# Altium footprint library 排针-排母-1.27.PcbLib: 152 footprints (part 8 of 10)
Each footprint in its own frame and in the unit in brackets; x right, y up, seen from the top. Pads: shape width x height; smd on the part's side, far side on the other; paste and mask are expansions set on the pad; w line width, h text height; cw(c..) or ccw(c..) is an arc to the next point about the centre after c.
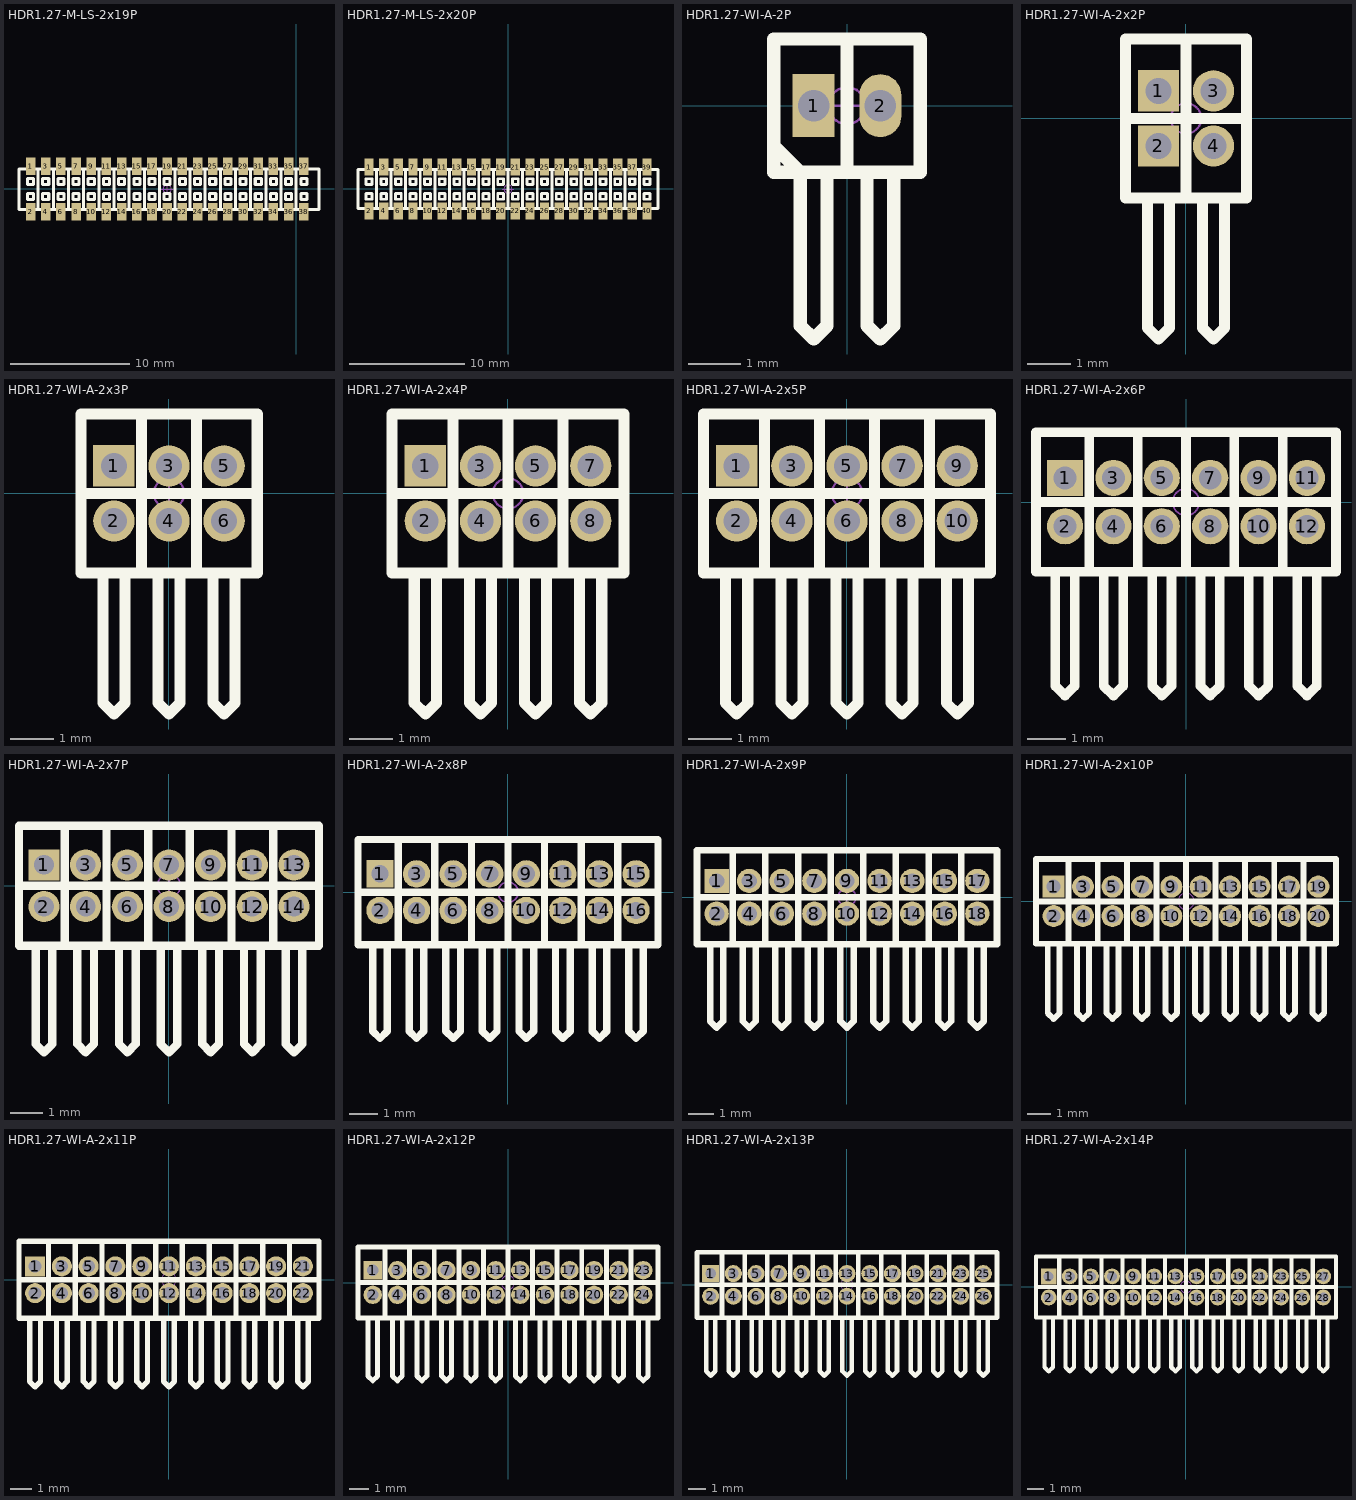
[diagram p7: the footprints below, top view; thin cyan lines are the x and y axes]

## HDR1.27-M-LS-2x19P [mm] "双排贴片排母，脚距：1.27mm"
pads (38):
  rect 0.8x1.5 smd: 1(-22.225,1.905) 2(-22.225,-1.905) 3(-20.955,1.905) 4(-20.955,-1.905) 5(-19.685,1.905) 6(-19.685,-1.905) 7(-18.415,1.905) 8(-18.415,-1.905) 9(-17.145,1.905) 10(-17.145,-1.905) 11(-15.875,1.905) 12(-15.875,-1.905) 13(-14.605,1.905) 14(-14.605,-1.905) 15(-13.335,1.905) 16(-13.335,-1.905) 17(-12.065,1.905) 18(-12.065,-1.905) 19(-10.795,1.905) 20(-10.795,-1.905) 21(-9.525,1.905) 22(-9.525,-1.905) 23(-8.255,1.905) 24(-8.255,-1.905) 25(-6.985,1.905) 26(-6.985,-1.905) 27(-5.715,1.905) 28(-5.715,-1.905) 29(-4.445,1.905) 30(-4.445,-1.905) 31(-3.175,1.905) 32(-3.175,-1.905) 33(-1.905,1.905) 34(-1.905,-1.905) 35(-0.635,1.905) 36(-0.635,-1.905) 37(0.635,1.905) 38(0.635,-1.905)
Top Overlay:
  drawing of 174 lines, arcs and shapes, not listed
Mechanical 15:
  circle w0.05: c-10.795,0 r0.35
  lines w0.05: -11.295,0 -10.295,0 ; -10.795,-0.5 -10.795,0.5
3D body: height 4.67, standoff 0, extent -12.7,-2.4 -11.43,2.4
3D body: height 4.67, standoff 0, extent -13.97,-2.4 -12.7,2.4
3D body: height 4.67, standoff 0, extent -15.24,-2.4 -13.97,2.4
3D body: height 4.67, standoff 0, extent -16.51,-2.4 -15.24,2.4
3D body: height 4.67, standoff 0, extent -17.78,-2.4 -16.51,2.4
3D body: height 4.67, standoff 0, extent -19.05,-2.4 -17.78,2.4
3D body: height 4.67, standoff 0, extent -20.32,-2.4 -19.05,2.4
3D body: height 4.67, standoff 0, extent -21.59,-2.4 -20.32,2.4
3D body: height 4.67, standoff 0, extent -23.06,-2.4 -21.59,2.4
3D body: height 4.67, standoff 0, extent 0,-2.4 1.47,2.4
3D body: height 4.67, standoff 0, extent -11.43,-2.4 -10.16,2.4
3D body: height 4.67, standoff 0, extent -10.16,-2.4 -8.89,2.4
3D body: height 4.67, standoff 0, extent -8.89,-2.4 -7.62,2.4
3D body: height 4.67, standoff 0, extent -7.62,-2.4 -6.35,2.4
3D body: height 4.67, standoff 0, extent -6.35,-2.4 -5.08,2.4
3D body: height 4.67, standoff 0, extent -5.08,-2.4 -3.81,2.4
3D body: height 4.67, standoff 0, extent -3.81,-2.4 -2.54,2.4
3D body: height 4.67, standoff 0, extent -2.54,-2.4 -1.27,2.4
3D body: height 4.67, standoff 0, extent -1.27,-2.4 0,2.4

## HDR1.27-M-LS-2x20P [mm] "双排贴片排母，脚距：1.27mm"
pads (40):
  rect 0.8x1.5 smd: 1(-12.065,1.905) 2(-12.065,-1.905) 3(-10.795,1.905) 4(-10.795,-1.905) 5(-9.525,1.905) 6(-9.525,-1.905) 7(-8.255,1.905) 8(-8.255,-1.905) 9(-6.985,1.905) 10(-6.985,-1.905) 11(-5.715,1.905) 12(-5.715,-1.905) 13(-4.445,1.905) 14(-4.445,-1.905) 15(-3.175,1.905) 16(-3.175,-1.905) 17(-1.905,1.905) 18(-1.905,-1.905) 19(-0.635,1.905) 20(-0.635,-1.905) 21(0.635,1.905) 22(0.635,-1.905) 23(1.905,1.905) 24(1.905,-1.905) 25(3.175,1.905) 26(3.175,-1.905) 27(4.445,1.905) 28(4.445,-1.905) 29(5.715,1.905) 30(5.715,-1.905) 31(6.985,1.905) 32(6.985,-1.905) 33(8.255,1.905) 34(8.255,-1.905) 35(9.525,1.905) 36(9.525,-1.905) 37(10.795,1.905) 38(10.795,-1.905) 39(12.065,1.905) 40(12.065,-1.905)
Top Overlay:
  drawing of 183 lines, arcs and shapes, not listed
Mechanical 15:
  circle w0.05: c0,0 r0.35
  lines w0.05: -0.5,0 0.5,0 ; 0,-0.5 0,0.5
3D body: height 4.67, standoff 0, extent 10.16,-2.4 11.43,2.4
3D body: height 4.67, standoff 0, extent 8.89,-2.4 10.16,2.4
3D body: height 4.67, standoff 0, extent 7.62,-2.4 8.89,2.4
3D body: height 4.67, standoff 0, extent 6.35,-2.4 7.62,2.4
3D body: height 4.67, standoff 0, extent 5.08,-2.4 6.35,2.4
3D body: height 4.67, standoff 0, extent 3.81,-2.4 5.08,2.4
3D body: height 4.67, standoff 0, extent 2.54,-2.4 3.81,2.4
3D body: height 4.67, standoff 0, extent 1.27,-2.4 2.54,2.4
3D body: height 4.67, standoff 0, extent 0,-2.4 1.27,2.4
3D body: height 4.67, standoff 0, extent -1.27,-2.4 0,2.4
3D body: height 4.67, standoff 0, extent 11.43,-2.4 12.9,2.4
3D body: height 4.67, standoff 0, extent -12.9,-2.4 -11.43,2.4
3D body: height 4.67, standoff 0, extent -11.43,-2.4 -10.16,2.4
3D body: height 4.67, standoff 0, extent -10.16,-2.4 -8.89,2.4
3D body: height 4.67, standoff 0, extent -8.89,-2.4 -7.62,2.4
3D body: height 4.67, standoff 0, extent -7.62,-2.4 -6.35,2.4
3D body: height 4.67, standoff 0, extent -6.35,-2.4 -5.08,2.4
3D body: height 4.67, standoff 0, extent -5.08,-2.4 -3.81,2.4
3D body: height 4.67, standoff 0, extent -3.81,-2.4 -2.54,2.4
3D body: height 4.67, standoff 0, extent -2.54,-2.4 -1.27,2.4

## HDR1.27-WI-A-2P [mm] "直插，脚距：1.27mm"
pads (2):
  rect 0.8x1.2 hole 0.6: 1(-0.635,0)
  oval 0.8x1.2 hole 0.6: 2(0.635,0)
Top Overlay:
  lines w0.254: -1.397,-0.762 -0.889,-1.27 ; -0.889,-1.397 -0.889,-4.191 -0.635,-4.445 -0.381,-4.191 -0.381,-1.27 ; 0,-1.27 0,1.27 ; 0.381,-1.397 0.381,-4.191 0.635,-4.445 0.889,-4.191 0.889,-1.27 ; -1.397,-1.27 -1.397,1.27 1.397,1.27 1.397,-1.27 -1.397,-1.27
Mechanical 15:
  circle w0.05: c0,0 r0.35
  lines w0.05: -0.5,0 0.5,0 ; 0,-0.5 0,0.5
3D body: height 3.96, standoff -2.72, extent -1.27,-4.7 1.27,1.2

## HDR1.27-WI-A-2x2P [mm] "双排直插，脚距：1.27mm"
pads (4):
  rect 0.95x0.95 hole 0.6: 1(-0.635,0.635) 2(-0.635,-0.635)
  round 0.95 hole 0.6: 3(0.635,0.635) 4(0.635,-0.635)
Top Overlay:
  lines w0.254: -1.397,0 1.397,0 ; -0.889,-1.905 -0.889,-4.826 -0.635,-5.08 -0.381,-4.826 -0.381,-1.905 ; 0,-1.829 0,1.829 ; 0.381,-1.905 0.381,-4.826 0.635,-5.08 0.889,-4.826 0.889,-1.905 ; -1.397,-1.829 1.397,-1.829 1.397,1.829 -1.397,1.829 -1.397,-1.829
Mechanical 15:
  circle w0.05: c0,0 r0.35
  lines w0.05: -0.5,0 0.5,0 ; 0,-0.5 0,0.5
3D body: height 5.14, standoff -2.65, extent -1.27,-4.7 0,1.7
3D body: height 5.14, standoff -2.65, extent 0,-4.7 1.27,1.7

## HDR1.27-WI-A-2x3P [mm] "双排直插，脚距：1.27mm"
pads (6):
  rect 0.95x0.95 hole 0.6: 1(-1.27,0.635)
  round 0.95 hole 0.6: 2(-1.27,-0.635) 3(0,0.635) 4(0,-0.635) 5(1.27,0.635) 6(1.27,-0.635)
Top Overlay:
  lines w0.254: -2.032,0 2.032,0 ; -1.524,-1.905 -1.524,-4.826 -1.27,-5.08 -1.016,-4.826 -1.016,-1.905 ; -0.635,-1.829 -0.635,1.829 ; -0.254,-1.905 -0.254,-4.826 0,-5.08 0.254,-4.826 0.254,-1.905 ; 0.635,-1.829 0.635,1.829 ; 1.016,-1.905 1.016,-4.826 1.27,-5.08 1.524,-4.826 1.524,-1.905 ; -2.032,-1.829 2.032,-1.829 2.032,1.829 -2.032,1.829 -2.032,-1.829
Mechanical 15:
  circle w0.05: c0,0 r0.35
  lines w0.05: -0.5,0 0.5,0 ; 0,-0.5 0,0.5
3D body: height 5.14, standoff -2.65, extent -1.905,-4.7 -0.635,1.7
3D body: height 5.14, standoff -2.65, extent -0.635,-4.7 0.635,1.7
3D body: height 5.14, standoff -2.65, extent 0.635,-4.7 1.905,1.7

## HDR1.27-WI-A-2x4P [mm] "双排直插，脚距：1.27mm"
pads (8):
  rect 0.95x0.95 hole 0.6: 1(-1.905,0.635)
  round 0.95 hole 0.6: 2(-1.905,-0.635) 3(-0.635,0.635) 4(-0.635,-0.635) 5(0.635,0.635) 6(0.635,-0.635) 7(1.905,0.635) 8(1.905,-0.635)
Top Overlay:
  lines w0.254: -2.667,0 2.667,0 ; -2.159,-1.905 -2.159,-4.826 -1.905,-5.08 -1.651,-4.826 -1.651,-1.905 ; -1.27,-1.829 -1.27,1.829 ; -0.889,-1.905 -0.889,-4.826 -0.635,-5.08 -0.381,-4.826 -0.381,-1.905 ; 0,-1.829 0,1.829 ; 0.381,-1.905 0.381,-4.826 0.635,-5.08 0.889,-4.826 0.889,-1.905 ; 1.27,-1.829 1.27,1.829 ; 1.651,-1.905 1.651,-4.826 1.905,-5.08 2.159,-4.826 2.159,-1.905 ; -2.667,-1.829 2.667,-1.829 2.667,1.829 -2.667,1.829 -2.667,-1.829
Mechanical 15:
  circle w0.05: c0,0 r0.35
  lines w0.05: -0.5,0 0.5,0 ; 0,-0.5 0,0.5
3D body: height 5.14, standoff -2.65, extent -2.54,-4.7 -1.27,1.7
3D body: height 5.14, standoff -2.65, extent -1.27,-4.7 0,1.7
3D body: height 5.14, standoff -2.65, extent 0,-4.7 1.27,1.7
3D body: height 5.14, standoff -2.65, extent 1.27,-4.7 2.54,1.7

## HDR1.27-WI-A-2x5P [mm] "双排直插，脚距：1.27mm"
pads (10):
  rect 0.95x0.95 hole 0.6: 1(-2.54,0.635)
  round 0.95 hole 0.6: 2(-2.54,-0.635) 3(-1.27,0.635) 4(-1.27,-0.635) 5(0,0.635) 6(0,-0.635) 7(1.27,0.635) 8(1.27,-0.635) 9(2.54,0.635) 10(2.54,-0.635)
Top Overlay:
  lines w0.254: -3.302,0 3.302,0 ; -2.794,-1.905 -2.794,-4.826 -2.54,-5.08 -2.286,-4.826 -2.286,-1.905 ; -1.905,-1.829 -1.905,1.829 ; -1.524,-1.905 -1.524,-4.826 -1.27,-5.08 -1.016,-4.826 -1.016,-1.905 ; -0.635,-1.829 -0.635,1.829 ; -0.254,-1.905 -0.254,-4.826 0,-5.08 0.254,-4.826 0.254,-1.905 ; 0.635,-1.829 0.635,1.829 ; 1.016,-1.905 1.016,-4.826 1.27,-5.08 1.524,-4.826 1.524,-1.905 ; 1.905,-1.829 1.905,1.829 ; 2.286,-1.905 2.286,-4.826 2.54,-5.08 2.794,-4.826 2.794,-1.905 ; -3.302,-1.829 3.302,-1.829 3.302,1.829 -3.302,1.829 -3.302,-1.829
Mechanical 15:
  circle w0.05: c0,0 r0.35
  lines w0.05: -0.5,0 0.5,0 ; 0,-0.5 0,0.5
3D body: height 5.14, standoff -2.65, extent -3.175,-4.7 -1.905,1.7
3D body: height 5.14, standoff -2.65, extent -1.905,-4.7 -0.635,1.7
3D body: height 5.14, standoff -2.65, extent -0.635,-4.7 0.635,1.7
3D body: height 5.14, standoff -2.65, extent 0.635,-4.7 1.905,1.7
3D body: height 5.14, standoff -2.65, extent 1.905,-4.7 3.175,1.7

## HDR1.27-WI-A-2x6P [mm] "双排直插，脚距：1.27mm"
pads (12):
  rect 0.95x0.95 hole 0.6: 1(-3.175,0.635)
  round 0.95 hole 0.6: 2(-3.175,-0.635) 3(-1.905,0.635) 4(-1.905,-0.635) 5(-0.635,0.635) 6(-0.635,-0.635) 7(0.635,0.635) 8(0.635,-0.635) 9(1.905,0.635) 10(1.905,-0.635) 11(3.175,0.635) 12(3.175,-0.635)
Top Overlay:
  lines w0.254: -3.937,0 3.937,0 ; -3.429,-1.905 -3.429,-4.826 -3.175,-5.08 -2.921,-4.826 -2.921,-1.905 ; -2.54,-1.829 -2.54,1.829 ; -2.159,-1.905 -2.159,-4.826 -1.905,-5.08 -1.651,-4.826 -1.651,-1.905 ; -1.27,-1.829 -1.27,1.829 ; -0.889,-1.905 -0.889,-4.826 -0.635,-5.08 -0.381,-4.826 -0.381,-1.905 ; 0,-1.829 0,1.829 ; 0.381,-1.905 0.381,-4.826 0.635,-5.08 0.889,-4.826 0.889,-1.905 ; 1.27,-1.829 1.27,1.829 ; 1.651,-1.905 1.651,-4.826 1.905,-5.08 2.159,-4.826 2.159,-1.905 ; 2.54,-1.829 2.54,1.829 ; 2.921,-1.905 2.921,-4.826 3.175,-5.08 3.429,-4.826 3.429,-1.905 ; -3.937,-1.829 -3.937,1.829 3.937,1.829 3.937,-1.829 -3.937,-1.829
Mechanical 15:
  circle w0.05: c0,0 r0.35
  lines w0.05: -0.5,0 0.5,0 ; 0,-0.5 0,0.5
3D body: height 5.14, standoff -2.65, extent 2.54,-4.7 3.81,1.7
3D body: height 5.14, standoff -2.65, extent 1.27,-4.7 2.54,1.7
3D body: height 5.14, standoff -2.65, extent 0,-4.7 1.27,1.7
3D body: height 5.14, standoff -2.65, extent -1.27,-4.7 0,1.7
3D body: height 5.14, standoff -2.65, extent -2.54,-4.7 -1.27,1.7
3D body: height 5.14, standoff -2.65, extent -3.81,-4.7 -2.54,1.7

## HDR1.27-WI-A-2x7P [mm] "双排直插，脚距：1.27mm"
pads (14):
  rect 0.95x0.95 hole 0.6: 1(-3.81,0.635)
  round 0.95 hole 0.6: 2(-3.81,-0.635) 3(-2.54,0.635) 4(-2.54,-0.635) 5(-1.27,0.635) 6(-1.27,-0.635) 7(0,0.635) 8(0,-0.635) 9(1.27,0.635) 10(1.27,-0.635) 11(2.54,0.635) 12(2.54,-0.635) 13(3.81,0.635) 14(3.81,-0.635)
Top Overlay:
  lines w0.254: -4.572,0 4.572,0 ; -4.064,-1.905 -4.064,-4.826 -3.81,-5.08 -3.556,-4.826 -3.556,-1.905 ; -3.175,-1.829 -3.175,1.829 ; -2.794,-1.905 -2.794,-4.826 -2.54,-5.08 -2.286,-4.826 -2.286,-1.905 ; -1.905,-1.829 -1.905,1.829 ; -1.524,-1.905 -1.524,-4.826 -1.27,-5.08 -1.016,-4.826 -1.016,-1.905 ; -0.635,-1.829 -0.635,1.829 ; -0.254,-1.905 -0.254,-4.826 0,-5.08 0.254,-4.826 0.254,-1.905 ; 0.635,-1.829 0.635,1.829 ; 1.016,-1.905 1.016,-4.826 1.27,-5.08 1.524,-4.826 1.524,-1.905 ; 1.905,-1.829 1.905,1.829 ; 2.286,-1.905 2.286,-4.826 2.54,-5.08 2.794,-4.826 2.794,-1.905 ; 3.175,-1.829 3.175,1.829 ; 3.556,-1.905 3.556,-4.826 3.81,-5.08 4.064,-4.826 4.064,-1.905 ; -4.572,-1.829 -4.572,1.829 4.572,1.829 4.572,-1.829 -4.572,-1.829
Mechanical 15:
  circle w0.05: c0,0 r0.35
  lines w0.05: -0.5,0 0.5,0 ; 0,-0.5 0,0.5
3D body: height 5.14, standoff -2.65, extent 3.175,-4.7 4.445,1.7
3D body: height 5.14, standoff -2.65, extent 1.905,-4.7 3.175,1.7
3D body: height 5.14, standoff -2.65, extent 0.635,-4.7 1.905,1.7
3D body: height 5.14, standoff -2.65, extent -0.635,-4.7 0.635,1.7
3D body: height 5.14, standoff -2.65, extent -1.905,-4.7 -0.635,1.7
3D body: height 5.14, standoff -2.65, extent -3.175,-4.7 -1.905,1.7
3D body: height 5.14, standoff -2.65, extent -4.445,-4.7 -3.175,1.7

## HDR1.27-WI-A-2x8P [mm] "双排直插，脚距：1.27mm"
pads (16):
  rect 0.95x0.95 hole 0.6: 1(-4.445,0.635)
  round 0.95 hole 0.6: 2(-4.445,-0.635) 3(-3.175,0.635) 4(-3.175,-0.635) 5(-1.905,0.635) 6(-1.905,-0.635) 7(-0.635,0.635) 8(-0.635,-0.635) 9(0.635,0.635) 10(0.635,-0.635) 11(1.905,0.635) 12(1.905,-0.635) 13(3.175,0.635) 14(3.175,-0.635) 15(4.445,0.635) 16(4.445,-0.635)
Top Overlay:
  lines w0.254: -5.207,0 5.207,0 ; -4.699,-1.905 -4.699,-4.826 -4.445,-5.08 -4.191,-4.826 -4.191,-1.905 ; -3.81,-1.829 -3.81,1.829 ; -3.429,-1.905 -3.429,-4.826 -3.175,-5.08 -2.921,-4.826 -2.921,-1.905 ; -2.54,-1.829 -2.54,1.829 ; -2.159,-1.905 -2.159,-4.826 -1.905,-5.08 -1.651,-4.826 -1.651,-1.905 ; -1.27,-1.829 -1.27,1.829 ; -0.889,-1.905 -0.889,-4.826 -0.635,-5.08 -0.381,-4.826 -0.381,-1.905 ; 0,-1.829 0,1.829 ; 0.381,-1.905 0.381,-4.826 0.635,-5.08 0.889,-4.826 0.889,-1.905 ; 1.27,-1.829 1.27,1.829 ; 1.651,-1.905 1.651,-4.826 1.905,-5.08 2.159,-4.826 2.159,-1.905 ; 2.54,-1.829 2.54,1.829 ; 2.921,-1.905 2.921,-4.826 3.175,-5.08 3.429,-4.826 3.429,-1.905 ; 3.81,-1.829 3.81,1.829 ; 4.191,-1.905 4.191,-4.826 4.445,-5.08 4.699,-4.826 4.699,-1.905 ; -5.207,-1.829 5.207,-1.829 5.207,1.829 -5.207,1.829 -5.207,-1.829
Mechanical 15:
  circle w0.05: c0,0 r0.35
  lines w0.05: -0.5,0 0.5,0 ; 0,-0.5 0,0.5
3D body: height 5.14, standoff -2.65, extent -5.08,-4.7 -3.81,1.7
3D body: height 5.14, standoff -2.65, extent -3.81,-4.7 -2.54,1.7
3D body: height 5.14, standoff -2.65, extent -2.54,-4.7 -1.27,1.7
3D body: height 5.14, standoff -2.65, extent -1.27,-4.7 0,1.7
3D body: height 5.14, standoff -2.65, extent 0,-4.7 1.27,1.7
3D body: height 5.14, standoff -2.65, extent 1.27,-4.7 2.54,1.7
3D body: height 5.14, standoff -2.65, extent 2.54,-4.7 3.81,1.7
3D body: height 5.14, standoff -2.65, extent 3.81,-4.7 5.08,1.7

## HDR1.27-WI-A-2x9P [mm] "双排直插，脚距：1.27mm"
pads (18):
  rect 0.95x0.95 hole 0.6: 1(-5.08,0.635)
  round 0.95 hole 0.6: 2(-5.08,-0.635) 3(-3.81,0.635) 4(-3.81,-0.635) 5(-2.54,0.635) 6(-2.54,-0.635) 7(-1.27,0.635) 8(-1.27,-0.635) 9(0,0.635) 10(0,-0.635) 11(1.27,0.635) 12(1.27,-0.635) 13(2.54,0.635) 14(2.54,-0.635) 15(3.81,0.635) 16(3.81,-0.635) 17(5.08,0.635) 18(5.08,-0.635)
Top Overlay:
  lines w0.254: -5.842,0 5.842,0 ; -5.334,-1.905 -5.334,-4.826 -5.08,-5.08 -4.826,-4.826 -4.826,-1.905 ; -4.445,-1.829 -4.445,1.829 ; -4.064,-1.905 -4.064,-4.826 -3.81,-5.08 -3.556,-4.826 -3.556,-1.905 ; -3.175,-1.829 -3.175,1.829 ; -2.794,-1.905 -2.794,-4.826 -2.54,-5.08 -2.286,-4.826 -2.286,-1.905 ; -1.905,-1.829 -1.905,1.829 ; -1.524,-1.905 -1.524,-4.826 -1.27,-5.08 -1.016,-4.826 -1.016,-1.905 ; -0.635,-1.829 -0.635,1.829 ; -0.254,-1.905 -0.254,-4.826 0,-5.08 0.254,-4.826 0.254,-1.905 ; 0.635,-1.829 0.635,1.829 ; 1.016,-1.905 1.016,-4.826 1.27,-5.08 1.524,-4.826 1.524,-1.905 ; 1.905,-1.829 1.905,1.829 ; 2.286,-1.905 2.286,-4.826 2.54,-5.08 2.794,-4.826 2.794,-1.905 ; 3.175,-1.829 3.175,1.829 ; 3.556,-1.905 3.556,-4.826 3.81,-5.08 4.064,-4.826 4.064,-1.905 ; 4.445,-1.829 4.445,1.829 ; 4.826,-1.905 4.826,-4.826 5.08,-5.08 5.334,-4.826 5.334,-1.905 ; -5.842,-1.829 5.842,-1.829 5.842,1.829 -5.842,1.829 -5.842,-1.829
Mechanical 15:
  circle w0.05: c0,0 r0.35
  lines w0.05: -0.5,0 0.5,0 ; 0,-0.5 0,0.5
3D body: height 5.14, standoff -2.65, extent -5.715,-4.7 -4.445,1.7
3D body: height 5.14, standoff -2.65, extent -4.445,-4.7 -3.175,1.7
3D body: height 5.14, standoff -2.65, extent -3.175,-4.7 -1.905,1.7
3D body: height 5.14, standoff -2.65, extent -1.905,-4.7 -0.635,1.7
3D body: height 5.14, standoff -2.65, extent -0.635,-4.7 0.635,1.7
3D body: height 5.14, standoff -2.65, extent 0.635,-4.7 1.905,1.7
3D body: height 5.14, standoff -2.65, extent 1.905,-4.7 3.175,1.7
3D body: height 5.14, standoff -2.65, extent 3.175,-4.7 4.445,1.7
3D body: height 5.14, standoff -2.65, extent 4.445,-4.7 5.715,1.7

## HDR1.27-WI-A-2x10P [mm] "双排直插，脚距：1.27mm"
pads (20):
  rect 0.95x0.95 hole 0.6: 1(-5.715,0.635)
  round 0.95 hole 0.6: 2(-5.715,-0.635) 3(-4.445,0.635) 4(-4.445,-0.635) 5(-3.175,0.635) 6(-3.175,-0.635) 7(-1.905,0.635) 8(-1.905,-0.635) 9(-0.635,0.635) 10(-0.635,-0.635) 11(0.635,0.635) 12(0.635,-0.635) 13(1.905,0.635) 14(1.905,-0.635) 15(3.175,0.635) 16(3.175,-0.635) 17(4.445,0.635) 18(4.445,-0.635) 19(5.715,0.635) 20(5.715,-0.635)
Top Overlay:
  lines w0.254: -6.477,0 6.477,0 ; -5.969,-1.905 -5.969,-4.826 -5.715,-5.08 -5.461,-4.826 -5.461,-1.905 ; -5.08,-1.829 -5.08,1.829 ; -4.699,-1.905 -4.699,-4.826 -4.445,-5.08 -4.191,-4.826 -4.191,-1.905 ; -3.81,-1.829 -3.81,1.829 ; -3.429,-1.905 -3.429,-4.826 -3.175,-5.08 -2.921,-4.826 -2.921,-1.905 ; -2.54,-1.829 -2.54,1.829 ; -2.159,-1.905 -2.159,-4.826 -1.905,-5.08 -1.651,-4.826 -1.651,-1.905 ; -1.27,-1.829 -1.27,1.829 ; -0.889,-1.905 -0.889,-4.826 -0.635,-5.08 -0.381,-4.826 -0.381,-1.905 ; 0,-1.829 0,1.829 ; 0.381,-1.905 0.381,-4.826 0.635,-5.08 0.889,-4.826 0.889,-1.905 ; 1.27,-1.829 1.27,1.829 ; 1.651,-1.905 1.651,-4.826 1.905,-5.08 2.159,-4.826 2.159,-1.905 ; 2.54,-1.829 2.54,1.829 ; 2.921,-1.905 2.921,-4.826 3.175,-5.08 3.429,-4.826 3.429,-1.905 ; 3.81,-1.829 3.81,1.829 ; 4.191,-1.905 4.191,-4.826 4.445,-5.08 4.699,-4.826 4.699,-1.905 ; 5.08,-1.829 5.08,1.829 ; 5.461,-1.905 5.461,-4.826 5.715,-5.08 5.969,-4.826 5.969,-1.905 ; -6.477,-1.829 6.477,-1.829 6.477,1.829 -6.477,1.829 -6.477,-1.829
Mechanical 15:
  circle w0.05: c0,0 r0.35
  lines w0.05: -0.5,0 0.5,0 ; 0,-0.5 0,0.5
3D body: height 5.14, standoff -2.65, extent -6.35,-4.7 -5.08,1.7
3D body: height 5.14, standoff -2.65, extent -5.08,-4.7 -3.81,1.7
3D body: height 5.14, standoff -2.65, extent -3.81,-4.7 -2.54,1.7
3D body: height 5.14, standoff -2.65, extent -2.54,-4.7 -1.27,1.7
3D body: height 5.14, standoff -2.65, extent -1.27,-4.7 0,1.7
3D body: height 5.14, standoff -2.65, extent 0,-4.7 1.27,1.7
3D body: height 5.14, standoff -2.65, extent 1.27,-4.7 2.54,1.7
3D body: height 5.14, standoff -2.65, extent 2.54,-4.7 3.81,1.7
3D body: height 5.14, standoff -2.65, extent 3.81,-4.7 5.08,1.7
3D body: height 5.14, standoff -2.65, extent 5.08,-4.7 6.35,1.7

## HDR1.27-WI-A-2x11P [mm] "双排直插，脚距：1.27mm"
pads (22):
  rect 0.95x0.95 hole 0.6: 1(-6.35,0.635)
  round 0.95 hole 0.6: 2(-6.35,-0.635) 3(-5.08,0.635) 4(-5.08,-0.635) 5(-3.81,0.635) 6(-3.81,-0.635) 7(-2.54,0.635) 8(-2.54,-0.635) 9(-1.27,0.635) 10(-1.27,-0.635) 11(0,0.635) 12(0,-0.635) 13(1.27,0.635) 14(1.27,-0.635) 15(2.54,0.635) 16(2.54,-0.635) 17(3.81,0.635) 18(3.81,-0.635) 19(5.08,0.635) 20(5.08,-0.635) 21(6.35,0.635) 22(6.35,-0.635)
Top Overlay:
  lines w0.254: -7.112,0 7.112,0 ; -6.604,-1.905 -6.604,-4.826 -6.35,-5.08 -6.096,-4.826 -6.096,-1.905 ; -5.715,-1.829 -5.715,1.829 ; -5.334,-1.905 -5.334,-4.826 -5.08,-5.08 -4.826,-4.826 -4.826,-1.905 ; -4.445,-1.829 -4.445,1.829 ; -4.064,-1.905 -4.064,-4.826 -3.81,-5.08 -3.556,-4.826 -3.556,-1.905 ; -3.175,-1.829 -3.175,1.829 ; -2.794,-1.905 -2.794,-4.826 -2.54,-5.08 -2.286,-4.826 -2.286,-1.905 ; -1.905,-1.829 -1.905,1.829 ; -1.524,-1.905 -1.524,-4.826 -1.27,-5.08 -1.016,-4.826 -1.016,-1.905 ; -0.635,-1.829 -0.635,1.829 ; -0.254,-1.905 -0.254,-4.826 0,-5.08 0.254,-4.826 0.254,-1.905 ; 0.635,-1.829 0.635,1.829 ; 1.016,-1.905 1.016,-4.826 1.27,-5.08 1.524,-4.826 1.524,-1.905 ; 1.905,-1.829 1.905,1.829 ; 2.286,-1.905 2.286,-4.826 2.54,-5.08 2.794,-4.826 2.794,-1.905 ; 3.175,-1.829 3.175,1.829 ; 3.556,-1.905 3.556,-4.826 3.81,-5.08 4.064,-4.826 4.064,-1.905 ; 4.445,-1.829 4.445,1.829 ; 4.826,-1.905 4.826,-4.826 5.08,-5.08 5.334,-4.826 5.334,-1.905 ; 5.715,-1.829 5.715,1.829 ; 6.096,-1.905 6.096,-4.826 6.35,-5.08 6.604,-4.826 6.604,-1.905 ; -7.112,-1.829 7.112,-1.829 7.112,1.829 -7.112,1.829 -7.112,-1.829
Mechanical 15:
  circle w0.05: c0,0 r0.35
  lines w0.05: -0.5,0 0.5,0 ; 0,-0.5 0,0.5
3D body: height 5.14, standoff -2.65, extent -6.985,-4.7 -5.715,1.7
3D body: height 5.14, standoff -2.65, extent -5.715,-4.7 -4.445,1.7
3D body: height 5.14, standoff -2.65, extent -4.445,-4.7 -3.175,1.7
3D body: height 5.14, standoff -2.65, extent -3.175,-4.7 -1.905,1.7
3D body: height 5.14, standoff -2.65, extent -1.905,-4.7 -0.635,1.7
3D body: height 5.14, standoff -2.65, extent -0.635,-4.7 0.635,1.7
3D body: height 5.14, standoff -2.65, extent 0.635,-4.7 1.905,1.7
3D body: height 5.14, standoff -2.65, extent 1.905,-4.7 3.175,1.7
3D body: height 5.14, standoff -2.65, extent 3.175,-4.7 4.445,1.7
3D body: height 5.14, standoff -2.65, extent 4.445,-4.7 5.715,1.7
3D body: height 5.14, standoff -2.65, extent 5.715,-4.7 6.985,1.7

## HDR1.27-WI-A-2x12P [mm] "双排直插，脚距：1.27mm"
pads (24):
  rect 0.95x0.95 hole 0.6: 1(-6.985,0.635)
  round 0.95 hole 0.6: 2(-6.985,-0.635) 3(-5.715,0.635) 4(-5.715,-0.635) 5(-4.445,0.635) 6(-4.445,-0.635) 7(-3.175,0.635) 8(-3.175,-0.635) 9(-1.905,0.635) 10(-1.905,-0.635) 11(-0.635,0.635) 12(-0.635,-0.635) 13(0.635,0.635) 14(0.635,-0.635) 15(1.905,0.635) 16(1.905,-0.635) 17(3.175,0.635) 18(3.175,-0.635) 19(4.445,0.635) 20(4.445,-0.635) 21(5.715,0.635) 22(5.715,-0.635) 23(6.985,0.635) 24(6.985,-0.635)
Top Overlay:
  lines w0.254: -7.747,0 7.747,0 ; -7.239,-1.905 -7.239,-4.826 -6.985,-5.08 -6.731,-4.826 -6.731,-1.905 ; -6.35,-1.829 -6.35,1.829 ; -5.969,-1.905 -5.969,-4.826 -5.715,-5.08 -5.461,-4.826 -5.461,-1.905 ; -5.08,-1.829 -5.08,1.829 ; -4.699,-1.905 -4.699,-4.826 -4.445,-5.08 -4.191,-4.826 -4.191,-1.905 ; -3.81,-1.829 -3.81,1.829 ; -3.429,-1.905 -3.429,-4.826 -3.175,-5.08 -2.921,-4.826 -2.921,-1.905 ; -2.54,-1.829 -2.54,1.829 ; -2.159,-1.905 -2.159,-4.826 -1.905,-5.08 -1.651,-4.826 -1.651,-1.905 ; -1.27,-1.829 -1.27,1.829 ; -0.889,-1.905 -0.889,-4.826 -0.635,-5.08 -0.381,-4.826 -0.381,-1.905 ; 0,-1.829 0,1.829 ; 0.381,-1.905 0.381,-4.826 0.635,-5.08 0.889,-4.826 0.889,-1.905 ; 1.27,-1.829 1.27,1.829 ; 1.651,-1.905 1.651,-4.826 1.905,-5.08 2.159,-4.826 2.159,-1.905 ; 2.54,-1.829 2.54,1.829 ; 2.921,-1.905 2.921,-4.826 3.175,-5.08 3.429,-4.826 3.429,-1.905 ; 3.81,-1.829 3.81,1.829 ; 4.191,-1.905 4.191,-4.826 4.445,-5.08 4.699,-4.826 4.699,-1.905 ; 5.08,-1.829 5.08,1.829 ; 5.461,-1.905 5.461,-4.826 5.715,-5.08 5.969,-4.826 5.969,-1.905 ; 6.35,-1.829 6.35,1.829 ; 6.731,-1.905 6.731,-4.826 6.985,-5.08 7.239,-4.826 7.239,-1.905 ; -7.747,-1.829 7.747,-1.829 7.747,1.829 -7.747,1.829 -7.747,-1.829
Mechanical 15:
  circle w0.05: c0,0 r0.35
  lines w0.05: -0.5,0 0.5,0 ; 0,-0.5 0,0.5
3D body: height 5.14, standoff -2.65, extent -7.62,-4.7 -6.35,1.7
3D body: height 5.14, standoff -2.65, extent -6.35,-4.7 -5.08,1.7
3D body: height 5.14, standoff -2.65, extent -5.08,-4.7 -3.81,1.7
3D body: height 5.14, standoff -2.65, extent -3.81,-4.7 -2.54,1.7
3D body: height 5.14, standoff -2.65, extent -2.54,-4.7 -1.27,1.7
3D body: height 5.14, standoff -2.65, extent -1.27,-4.7 0,1.7
3D body: height 5.14, standoff -2.65, extent 0,-4.7 1.27,1.7
3D body: height 5.14, standoff -2.65, extent 1.27,-4.7 2.54,1.7
3D body: height 5.14, standoff -2.65, extent 2.54,-4.7 3.81,1.7
3D body: height 5.14, standoff -2.65, extent 3.81,-4.7 5.08,1.7
3D body: height 5.14, standoff -2.65, extent 5.08,-4.7 6.35,1.7
3D body: height 5.14, standoff -2.65, extent 6.35,-4.7 7.62,1.7

## HDR1.27-WI-A-2x13P [mm] "双排直插，脚距：1.27mm"
pads (26):
  rect 0.95x0.95 hole 0.6: 1(-7.62,0.635)
  round 0.95 hole 0.6: 2(-7.62,-0.635) 3(-6.35,0.635) 4(-6.35,-0.635) 5(-5.08,0.635) 6(-5.08,-0.635) 7(-3.81,0.635) 8(-3.81,-0.635) 9(-2.54,0.635) 10(-2.54,-0.635) 11(-1.27,0.635) 12(-1.27,-0.635) 13(0,0.635) 14(0,-0.635) 15(1.27,0.635) 16(1.27,-0.635) 17(2.54,0.635) 18(2.54,-0.635) 19(3.81,0.635) 20(3.81,-0.635) 21(5.08,0.635) 22(5.08,-0.635) 23(6.35,0.635) 24(6.35,-0.635) 25(7.62,0.635) 26(7.62,-0.635)
Top Overlay:
  lines w0.254: -8.382,0 8.382,0 ; -7.874,-1.905 -7.874,-4.826 -7.62,-5.08 -7.366,-4.826 -7.366,-1.905 ; -6.985,-1.829 -6.985,1.829 ; -6.604,-1.905 -6.604,-4.826 -6.35,-5.08 -6.096,-4.826 -6.096,-1.905 ; -5.715,-1.829 -5.715,1.829 ; -5.334,-1.905 -5.334,-4.826 -5.08,-5.08 -4.826,-4.826 -4.826,-1.905 ; -4.445,-1.829 -4.445,1.829 ; -4.064,-1.905 -4.064,-4.826 -3.81,-5.08 -3.556,-4.826 -3.556,-1.905 ; -3.175,-1.829 -3.175,1.829 ; -2.794,-1.905 -2.794,-4.826 -2.54,-5.08 -2.286,-4.826 -2.286,-1.905 ; -1.905,-1.829 -1.905,1.829 ; -1.524,-1.905 -1.524,-4.826 -1.27,-5.08 -1.016,-4.826 -1.016,-1.905 ; -0.635,-1.829 -0.635,1.829 ; -0.254,-1.905 -0.254,-4.826 0,-5.08 0.254,-4.826 0.254,-1.905 ; 0.635,-1.829 0.635,1.829 ; 1.016,-1.905 1.016,-4.826 1.27,-5.08 1.524,-4.826 1.524,-1.905 ; 1.905,-1.829 1.905,1.829 ; 2.286,-1.905 2.286,-4.826 2.54,-5.08 2.794,-4.826 2.794,-1.905 ; 3.175,-1.829 3.175,1.829 ; 3.556,-1.905 3.556,-4.826 3.81,-5.08 4.064,-4.826 4.064,-1.905 ; 4.445,-1.829 4.445,1.829 ; 4.826,-1.905 4.826,-4.826 5.08,-5.08 5.334,-4.826 5.334,-1.905 ; 5.715,-1.829 5.715,1.829 ; 6.096,-1.905 6.096,-4.826 6.35,-5.08 6.604,-4.826 6.604,-1.905 ; 6.985,-1.829 6.985,1.829 ; 7.366,-1.905 7.366,-4.826 7.62,-5.08 7.874,-4.826 7.874,-1.905 ; -8.382,-1.829 8.382,-1.829 8.382,1.829 -8.382,1.829 -8.382,-1.829
Mechanical 15:
  circle w0.05: c0,0 r0.35
  lines w0.05: -0.5,0 0.5,0 ; 0,-0.5 0,0.5
3D body: height 5.14, standoff -2.65, extent -8.255,-4.7 -6.985,1.7
3D body: height 5.14, standoff -2.65, extent -6.985,-4.7 -5.715,1.7
3D body: height 5.14, standoff -2.65, extent -5.715,-4.7 -4.445,1.7
3D body: height 5.14, standoff -2.65, extent -4.445,-4.7 -3.175,1.7
3D body: height 5.14, standoff -2.65, extent -3.175,-4.7 -1.905,1.7
3D body: height 5.14, standoff -2.65, extent -1.905,-4.7 -0.635,1.7
3D body: height 5.14, standoff -2.65, extent -0.635,-4.7 0.635,1.7
3D body: height 5.14, standoff -2.65, extent 0.635,-4.7 1.905,1.7
3D body: height 5.14, standoff -2.65, extent 1.905,-4.7 3.175,1.7
3D body: height 5.14, standoff -2.65, extent 3.175,-4.7 4.445,1.7
3D body: height 5.14, standoff -2.65, extent 4.445,-4.7 5.715,1.7
3D body: height 5.14, standoff -2.65, extent 5.715,-4.7 6.985,1.7
3D body: height 5.14, standoff -2.65, extent 6.985,-4.7 8.255,1.7

## HDR1.27-WI-A-2x14P [mm] "双排直插，脚距：1.27mm"
pads (28):
  rect 0.95x0.95 hole 0.6: 1(-8.255,0.635)
  round 0.95 hole 0.6: 2(-8.255,-0.635) 3(-6.985,0.635) 4(-6.985,-0.635) 5(-5.715,0.635) 6(-5.715,-0.635) 7(-4.445,0.635) 8(-4.445,-0.635) 9(-3.175,0.635) 10(-3.175,-0.635) 11(-1.905,0.635) 12(-1.905,-0.635) 13(-0.635,0.635) 14(-0.635,-0.635) 15(0.635,0.635) 16(0.635,-0.635) 17(1.905,0.635) 18(1.905,-0.635) 19(3.175,0.635) 20(3.175,-0.635) 21(4.445,0.635) 22(4.445,-0.635) 23(5.715,0.635) 24(5.715,-0.635) 25(6.985,0.635) 26(6.985,-0.635) 27(8.255,0.635) 28(8.255,-0.635)
Top Overlay:
  lines w0.254: -9.017,0 9.017,0 ; -8.509,-1.905 -8.509,-4.826 -8.255,-5.08 -8.001,-4.826 -8.001,-1.905 ; -7.62,-1.829 -7.62,1.829 ; -7.239,-1.905 -7.239,-4.826 -6.985,-5.08 -6.731,-4.826 -6.731,-1.905 ; -6.35,-1.829 -6.35,1.829 ; -5.969,-1.905 -5.969,-4.826 -5.715,-5.08 -5.461,-4.826 -5.461,-1.905 ; -5.08,-1.829 -5.08,1.829 ; -4.699,-1.905 -4.699,-4.826 -4.445,-5.08 -4.191,-4.826 -4.191,-1.905 ; -3.81,-1.829 -3.81,1.829 ; -3.429,-1.905 -3.429,-4.826 -3.175,-5.08 -2.921,-4.826 -2.921,-1.905 ; -2.54,-1.829 -2.54,1.829 ; -2.159,-1.905 -2.159,-4.826 -1.905,-5.08 -1.651,-4.826 -1.651,-1.905 ; -1.27,-1.829 -1.27,1.829 ; -0.889,-1.905 -0.889,-4.826 -0.635,-5.08 -0.381,-4.826 -0.381,-1.905 ; 0,-1.829 0,1.829 ; 0.381,-1.905 0.381,-4.826 0.635,-5.08 0.889,-4.826 0.889,-1.905 ; 1.27,-1.829 1.27,1.829 ; 1.651,-1.905 1.651,-4.826 1.905,-5.08 2.159,-4.826 2.159,-1.905 ; 2.54,-1.829 2.54,1.829 ; 2.921,-1.905 2.921,-4.826 3.175,-5.08 3.429,-4.826 3.429,-1.905 ; 3.81,-1.829 3.81,1.829 ; 4.191,-1.905 4.191,-4.826 4.445,-5.08 4.699,-4.826 4.699,-1.905 ; 5.08,-1.829 5.08,1.829 ; 5.461,-1.905 5.461,-4.826 5.715,-5.08 5.969,-4.826 5.969,-1.905 ; 6.35,-1.829 6.35,1.829 ; 6.731,-1.905 6.731,-4.826 6.985,-5.08 7.239,-4.826 7.239,-1.905 ; 7.62,-1.829 7.62,1.829 ; 8.001,-1.905 8.001,-4.826 8.255,-5.08 8.509,-4.826 8.509,-1.905 ; -9.017,-1.829 9.017,-1.829 9.017,1.829 -9.017,1.829 -9.017,-1.829
Mechanical 15:
  circle w0.05: c0,0 r0.35
  lines w0.05: -0.5,0 0.5,0 ; 0,-0.5 0,0.5
3D body: height 5.14, standoff -2.65, extent -8.89,-4.7 -7.62,1.7
3D body: height 5.14, standoff -2.65, extent -7.62,-4.7 -6.35,1.7
3D body: height 5.14, standoff -2.65, extent -6.35,-4.7 -5.08,1.7
3D body: height 5.14, standoff -2.65, extent -5.08,-4.7 -3.81,1.7
3D body: height 5.14, standoff -2.65, extent -3.81,-4.7 -2.54,1.7
3D body: height 5.14, standoff -2.65, extent -2.54,-4.7 -1.27,1.7
3D body: height 5.14, standoff -2.65, extent -1.27,-4.7 0,1.7
3D body: height 5.14, standoff -2.65, extent 0,-4.7 1.27,1.7
3D body: height 5.14, standoff -2.65, extent 1.27,-4.7 2.54,1.7
3D body: height 5.14, standoff -2.65, extent 2.54,-4.7 3.81,1.7
3D body: height 5.14, standoff -2.65, extent 3.81,-4.7 5.08,1.7
3D body: height 5.14, standoff -2.65, extent 5.08,-4.7 6.35,1.7
3D body: height 5.14, standoff -2.65, extent 6.35,-4.7 7.62,1.7
3D body: height 5.14, standoff -2.65, extent 7.62,-4.7 8.89,1.7